# Altium footprint library PTH-Footprint.PcbLib: 58 footprints (part 1 of 4)
Each footprint in its own frame and in the unit in brackets; x right, y up, seen from the top. Pads: shape width x height; smd on the part's side, far side on the other; paste and mask are expansions set on the pad; w line width, h text height; cw(c..) or ccw(c..) is an arc to the next point about the centre after c.
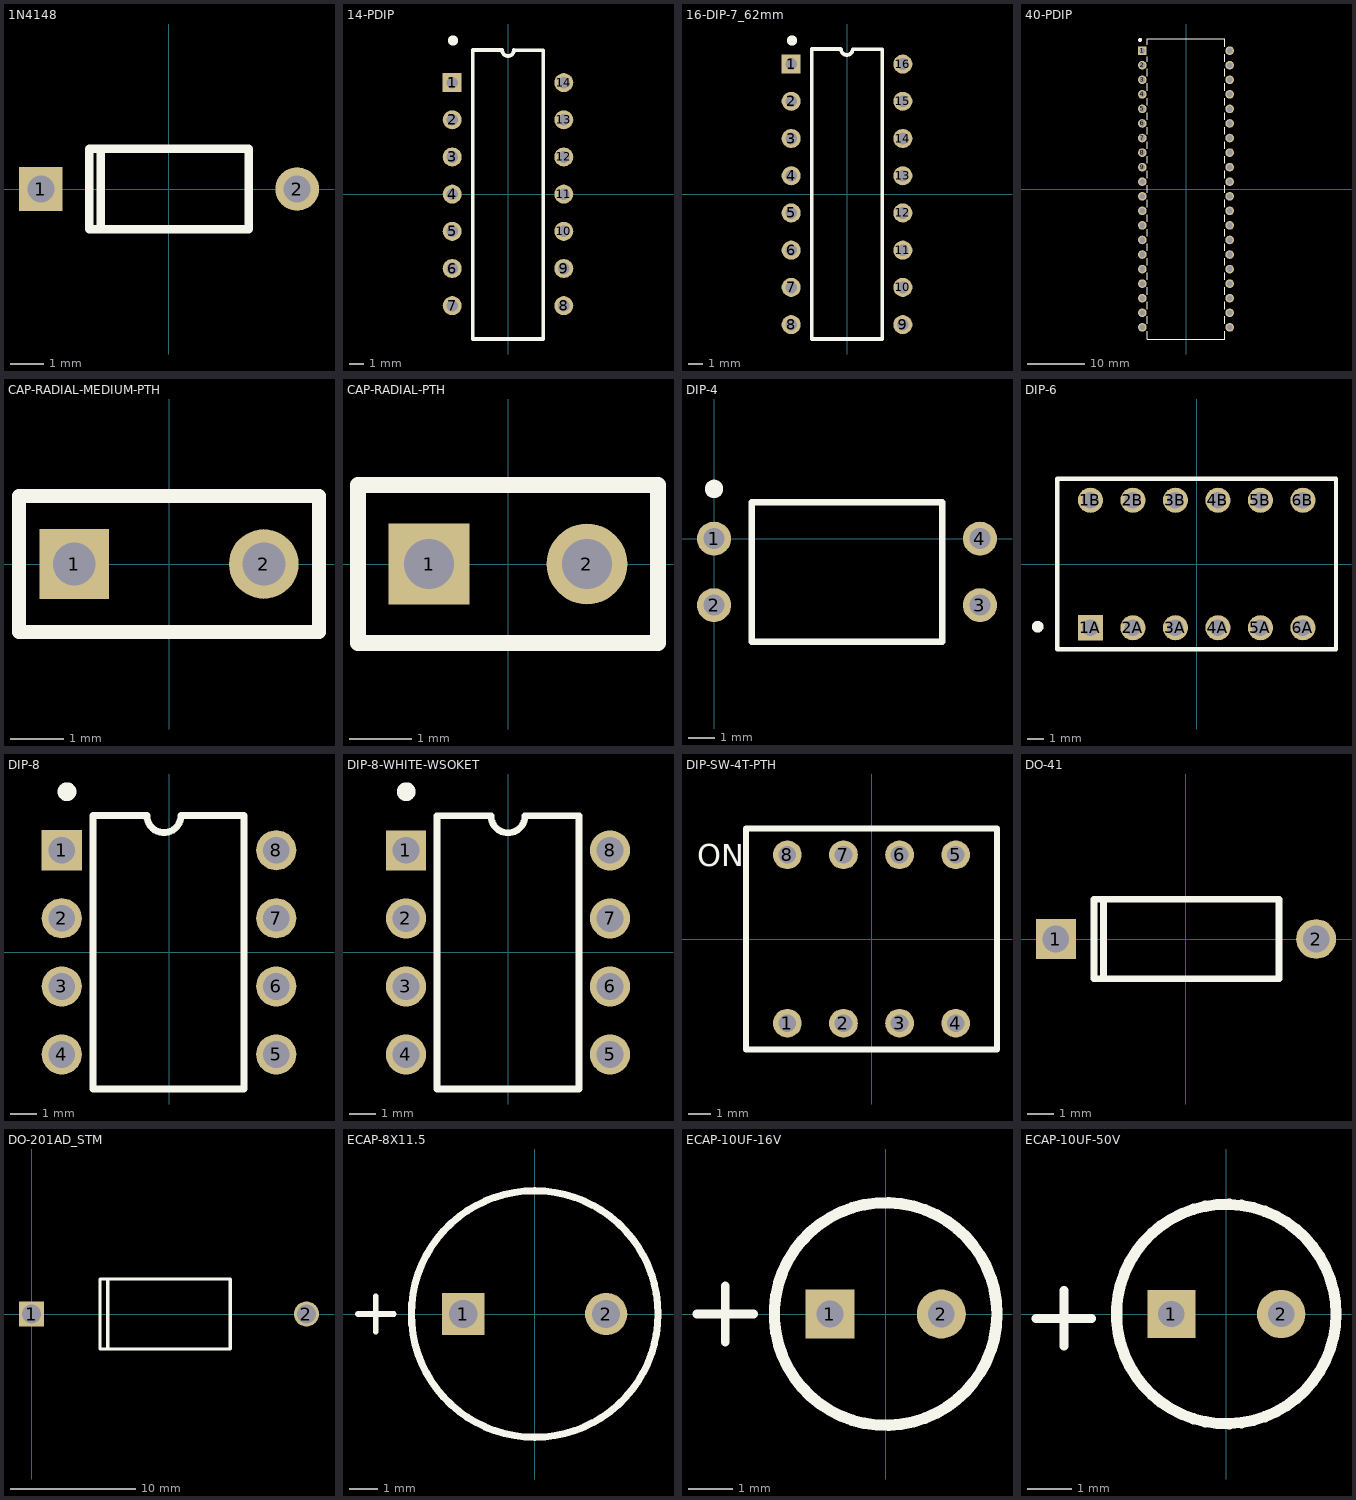
[diagram p0: the footprints below, top view; thin cyan lines are the x and y axes]

## 1N4148 [mm]
pads (2):
  rect 1.3x1.3 hole 0.8 paste-2539.97 mask+0: 1(-3.813,0)
  round 1.3 hole 0.8 paste-2539.97 mask+0: 2(3.813,0)
Top Overlay:
  lines w0.254: -2.025,1.2 -2.025,-1.2 -2.375,-1.2 ; -2.375,-1.2 -2.375,1.2 2.375,1.2 2.375,-1.2 -2.375,-1.2
3D body "Diode_ON_Semiconductor_1N914B_eec.STEP": height 0.25, standoff 0, extent -4.513,-1.055 4.513,1.055

## 14-PDIP [mm]
pads (14):
  rect 1.3x1.3 hole 0.8: 1(-3.81,7.62)
  round 1.3 hole 0.8: 2(-3.81,5.08) 3(-3.81,2.54) 4(-3.81,0) 5(-3.81,-2.54) 6(-3.81,-5.08) 7(-3.81,-7.62) 8(3.81,-7.62) 9(3.81,-5.08) 10(3.81,-2.54) 11(3.81,0) 12(3.81,2.54) 13(3.81,5.08) 14(3.81,7.62)
Top Overlay:
  circle w0.5: c-3.75,10.5 r0.1
  lines w0.254: -0.421,9.85 -2.4,9.85 -2.4,-9.896 2.4,-9.896 2.4,9.835 0.421,9.835 ; -0.4,9.842 ccw(c0,9.842) 0.4,9.842
3D body "N0014A-BLK.STEP": height 5.27, standoff -3.1, extent -3.937,-9.842 3.937,9.842

## 16-DIP-7_62mm [mm]
height 4.5
pads (16):
  rect 1.3x1.3 hole 0.8: 1(-3.81,8.89)
  round 1.3 hole 0.8: 2(-3.81,6.35) 3(-3.81,3.81) 4(-3.81,1.27) 5(-3.81,-1.27) 6(-3.81,-3.81) 7(-3.81,-6.35) 8(-3.81,-8.89) 9(3.81,-8.89) 10(3.81,-6.35) 11(3.81,-3.81) 12(3.81,-1.27) 13(3.81,1.27) 14(3.81,3.81) 15(3.81,6.35) 16(3.81,8.89)
Top Overlay:
  circle w0.5: c-3.75,10.5 r0.1
  lines w0.254: -2.411,9.915 -0.432,9.915 ; -2.4,9.875 -2.4,-9.871 2.4,-9.871 2.4,9.875 ; -0.411,9.908 ccw(c-0.011,9.908) 0.389,9.908 ; 0.411,9.9 2.389,9.9
3D body "User Library-DIP-16P-M03.step": height 4.66, standoff -3, extent -3.935,-9.748 3.935,9.652

## 40-PDIP [mm]
pads (40):
  rect 1.5x1.5 hole 1 paste-2539.97 mask+0: 1(-7.62,24.13)
  round 1.5 hole 1 paste-2539.97 mask+0: 2(-7.62,21.59) 3(-7.62,19.05) 4(-7.62,16.51) 5(-7.62,13.97) 6(-7.62,11.43) 7(-7.62,8.89) 8(-7.62,6.35) 9(-7.62,3.81) 10(-7.62,1.27) 11(-7.62,-1.27) 12(-7.62,-3.81) 13(-7.62,-6.35) 14(-7.62,-8.89) 15(-7.62,-11.43) 16(-7.62,-13.97) 17(-7.62,-16.51) 18(-7.62,-19.05) 19(-7.62,-21.59) 20(-7.62,-24.13) 21(7.62,-24.13) 22(7.62,-21.59) 23(7.62,-19.05) 24(7.62,-16.51) 25(7.62,-13.97) 26(7.62,-11.43) 27(7.62,-8.89) 28(7.62,-6.35) 29(7.62,-3.81) 30(7.62,-1.27) 31(7.62,1.27) 32(7.62,3.81) 33(7.62,6.35) 34(7.62,8.89) 35(7.62,11.43) 36(7.62,13.97) 37(7.62,16.51) 38(7.62,19.05) 39(7.62,21.59) 40(7.62,24.13)
Top Overlay:
  circle w0.5: c-8,26 r0.1
  lines w0.152: -6.731,-24.769 -6.731,-26.162 6.731,-26.162 6.731,-24.769 ; -6.731,-23.491 -6.731,-22.229 ; -6.731,-20.951 -6.731,-19.689 ; -6.731,-18.411 -6.731,-17.149 ; -6.731,-15.871 -6.731,-14.609 ; -6.731,-13.331 -6.731,-12.069 ; -6.731,-10.791 -6.731,-9.529 ; -6.731,-8.251 -6.731,-6.989 ; -6.731,-5.711 -6.731,-4.449 ; -6.731,-3.171 -6.731,-1.909 ; -6.731,-0.631 -6.731,0.631 ; -6.731,1.909 -6.731,3.171 ; -6.731,4.449 -6.731,5.711 ; -6.731,6.989 -6.731,8.251 ; -6.731,9.529 -6.731,10.791 ; -6.731,12.069 -6.731,13.331 ; -6.731,14.609 -6.731,15.871 ; -6.731,17.149 -6.731,18.411 ; -6.731,19.689 -6.731,20.951 ; -6.731,22.229 -6.731,23.06 ; -6.731,25.2 -6.731,26.162 6.731,26.162 6.731,24.769 ; 6.731,-23.491 6.731,-22.229 ; 6.731,-20.951 6.731,-19.689 ; 6.731,-18.411 6.731,-17.149 ; 6.731,-15.871 6.731,-14.609 ; 6.731,-13.331 6.731,-12.069 ; 6.731,-10.791 6.731,-9.529 ; 6.731,-8.251 6.731,-6.989 ; 6.731,-5.711 6.731,-4.449 ; 6.731,-3.171 6.731,-1.909 ; 6.731,-0.631 6.731,0.631 ; 6.731,1.909 6.731,3.171 ; 6.731,4.449 6.731,5.711 ; 6.731,6.989 6.731,8.251 ; 6.731,9.529 6.731,10.791 ; 6.731,12.069 6.731,13.331 ; 6.731,14.609 6.731,15.871 ; 6.731,17.149 6.731,18.411 ; 6.731,19.689 6.731,20.951 ; 6.731,22.229 6.731,23.491
3D body "ATMEGA32A-PU.step": height 6.35, standoff -5.08, extent -7.766,-25.876 7.766,25.876

## CAP-RADIAL-MEDIUM-PTH [mm]
pads (2):
  rect 1.3x1.3 hole 0.8 paste-2539.97 mask+0: 1(-1.77,0)
  round 1.3 hole 0.8 paste-2539.97 mask+0: 2(1.77,0)
Top Overlay:
  lines w0.254: -2.8,-1.27 -2.8,1.27 2.8,1.27 2.8,-1.27 -2.8,-1.27
3D body "N_CAP_3.54MM.STEP": height 6.85, standoff -4.18, extent -2.35,-1.25 2.35,1.25

## CAP-RADIAL-PTH [mm]
pads (2):
  rect 1.3x1.3 hole 0.8 paste-2539.97 mask+0: 1(-1.27,0)
  round 1.3 hole 0.8 paste-2539.97 mask+0: 2(1.27,0)
Top Overlay:
  lines w0.254: -2.413,-1.27 -2.413,1.27 2.413,1.27 2.413,-1.27 -2.413,-1.27
3D body "10pF Ceramic Disc 2.SLDPRT": height 6.85, standoff -7.18, extent -2.347,-1.25 2.345,1.25

## DIP-4 [mm]
pads (4):
  round 1.3 hole 0.8 paste-2539.97 mask+0: 1(0,0) 2(0,-2.54) 3(10.16,-2.54) 4(10.16,0)
Top Overlay:
  circle w0.5: c0,1.9 r0.1
  lines w0.254: 1.448,-3.937 1.448,1.397 8.712,1.397 8.712,-3.937 1.448,-3.937
3D body "PC817XF_SHP.step": height 4.12, standoff -2.54, extent -0.127,-3.81 10.541,1.27

## DIP-6 [mm]
height 7
pads (12):
  rect 1.5x1.5 hole 1: 1A(-6.35,-3.81)
  round 1.5 hole 1: 1B(-6.35,3.81) 2A(-3.81,-3.81) 2B(-3.81,3.81) 3A(-1.27,-3.81) 3B(-1.27,3.81) 4A(1.27,-3.81) 4B(1.27,3.81) 5A(3.81,-3.81) 5B(3.81,3.81) 6A(6.35,-3.81) 6B(6.35,3.81)
Top Overlay:
  circle w0.5: c-9.5,-3.75 r0.1
  lines w0.254: -8.33,-5.1 8.33,-5.1 8.33,5.1 -8.33,5.1 -8.33,-5.1
3D body "CUI_DEVICES_DS01C-254-L-06BE.step": height 6.68, standoff -3.68, extent -8.225,-4.95 8.435,4.95

## DIP-8 [mm] "DIP, 8-Leads, Body 10.16x6.85mm, Pitch 2.54mm"
height 4.54
pads (8):
  rect 1.5x1.5 hole 1: 1(-4,3.81)
  round 1.5 hole 1: 2(-4,1.27) 3(-4,-1.27) 4(-4,-3.81) 5(4,-3.81) 6(4,-1.27) 7(4,1.27) 8(4,3.81)
Top Overlay:
  circle w0.5: c-3.808,5.994 r0.1
  lines w0.254: -2.84,-5.1 2.8,-5.1 2.8,5.1 0.445,5.1 cw(c-0.19,5.1) -0.825,5.1 -2.84,5.1 -2.84,-5.1
3D body "DIP-8 N-BLK.STEP": height 4, standoff -3.35, extent -4.568,-4.9 4.568,4.9

## DIP-8-WHITE-WSOKET [mm] "DIP, 8-Leads, Body 10.16x6.85mm, Pitch 2.54mm"
height 4.54
pads (8):
  rect 1.5x1.5 hole 1: 1(-3.81,3.81)
  round 1.5 hole 1: 2(-3.81,1.27) 3(-3.81,-1.27) 4(-3.81,-3.81) 5(3.81,-3.81) 6(3.81,-1.27) 7(3.81,1.27) 8(3.81,3.81)
Top Overlay:
  circle w0.5: c-3.8,6 r0.1
  lines w0.254: -2.65,-5.1 -2.65,5.1 -0.635,5.1 ccw(c0,5.1) 0.635,5.1 2.65,5.1 2.65,-5.1 -2.65,-5.1
3D body "DIP-8 W7.62mm IC with Socket - BRANCO.STEP": height 7.88, standoff -3.13, extent -5.08,-5.103 5.12,5.357

## DIP-SW-4T-PTH [mm] "2.54 mm compact THT with raised actuator, 4p"
height 6.3
pads (8):
  round 1.3 hole 0.8: 1(-3.81,-3.81) 2(-1.27,-3.81) 3(1.27,-3.81) 4(3.81,-3.81) 5(3.81,3.81) 6(1.27,3.81) 7(-1.27,3.81) 8(-3.81,3.81)
Top Overlay:
  lines w0.254: -5.68,-5 5.68,-5 5.68,5 -5.68,5 -5.68,-5
  text "ON" at -7.9,3.3 h1.02
3D body "418117270904.stp": height 6.9, standoff -3.65, extent -5.58,-4.95 5.58,4.95

## DO-41 [mm]
pads (2):
  rect 1.5x1.5 hole 1 paste-2539.97 mask+0: 1(-4.9,0)
  round 1.5 hole 1 paste-2539.97 mask+0: 2(4.9,0)
Top Overlay:
  lines w0.254: -3.25,-1.5 3.5,-1.5 3.5,1.5 -3.462,1.5 -3.462,-1.5 -3.112,-1.5 -3.112,1.5
3D body "1N4734ATR.step": height 2.71, standoff -21.88, extent -5.288,-1.36 5.288,1.36

## DO-201AD_STM [mm]
pads (2):
  rect 2x2 hole 1.5 paste-2539.97 mask+0: 1(0,0)
  round 2 hole 1.5 paste-2539.97 mask+0: 2(21.895,0)
Top Overlay:
  lines w0.254: 6.071,-2.781 5.456,-2.781 5.45,-2.775 5.45,2.775 5.456,2.781 6.071,2.781 ; 6.071,-2.781 15.824,-2.781 15.824,2.781 6.071,2.781 ; 6.071,-2.781 6.071,2.781
3D body "DO-201AD_STM-COR_CORRIGIDA.STEP": height 5.31, standoff -2.54, extent -0.648,-2.646 22.542,2.646

## ECAP-8X11.5 [mm]
pads (2):
  rect 1.5x1.5 hole 1 paste-2539.97 mask+0: 1(-2.54,0)
  round 1.5 hole 1 paste-2539.97 mask+0: 2(2.54,0)
Top Overlay:
  circle w0.254: c0,0 r4.381
  lines w0.2: -6.278,0 -5.008,0 ; -5.643,-0.635 -5.643,0.635
3D body "EEUFM1A471B.step": height 11.5, standoff -17, extent -4,-3.992 4,3.992

## ECAP-10UF-16V [mm]
pads (2):
  rect 1.1x1.1 hole 0.6: 1(-1.25,0)
  round 1.1 hole 0.6: 2(1.25,0)
Top Overlay:
  circle w0.254: c0,0 r2.5
  lines w0.2: -4.235,0 -2.965,0 ; -3.6,-0.635 -3.6,0.635
3D body "step_temp.STEP": height 11, standoff -17, extent -2.493,-2.5 2.5,2.5

## ECAP-10UF-50V [mm]
pads (2):
  rect 1.1x1.1 hole 0.6: 1(-1.25,0)
  round 1.1 hole 0.6: 2(1.25,0)
Top Overlay:
  circle w0.254: c0,0 r2.5
  lines w0.2: -4.335,-0.1 -3.065,-0.1 ; -3.7,-0.735 -3.7,0.535
3D body "ECA1HHG100I.step": height 11, standoff -17, extent -2.493,-2.5 2.5,2.5